# Altium footprint library XU-GENARAL PCB .PcbLib: 1176 footprints (part 11 of 75)
Each footprint in its own frame and in the unit in brackets; x right, y up, seen from the top. Pads: shape width x height; smd on the part's side, far side on the other; paste and mask are expansions set on the pad; w line width, h text height; cw(c..) or ccw(c..) is an arc to the next point about the centre after c.
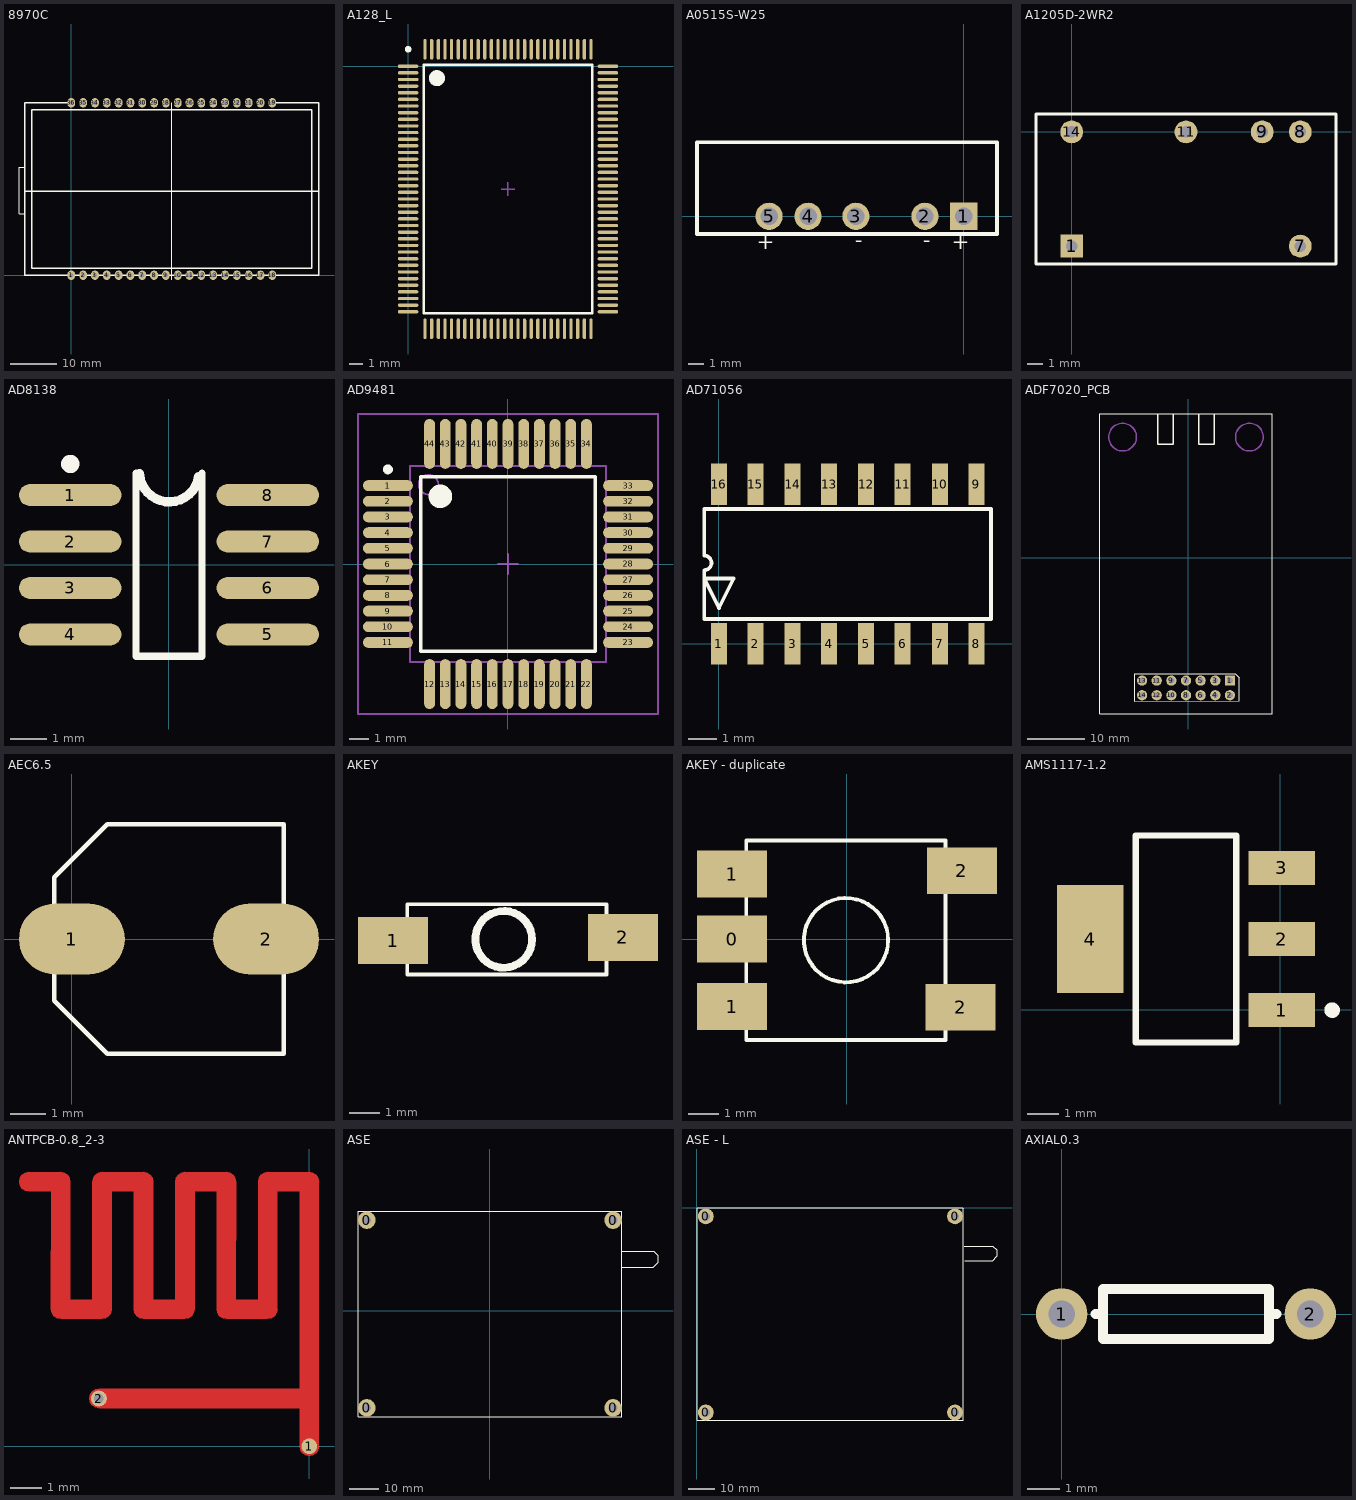
[diagram p10: the footprints below, top view; thin cyan lines are the x and y axes]

## 8970C [mil]
pads (36):
  oval 65x80 hole 35: 1(0,0) 2(100,0) 3(200,0) 4(300,0) 5(400,0) 6(500,0.07) 7(600,0.07) 8(700,0.07) 9(800,0.07) 10(900,0.07) 11(1000,0.07) 12(1100,0.07) 13(1200,0.07) 14(1300,0.07) 15(1400,0.07) 16(1500,0.07) 17(1600,0.07) 18(1700,0.07) 19(1700,1458.66) 20(1600,1458.66) 21(1500,1458.66) 22(1400,1458.66) 23(1300,1458.66) 24(1200,1458.66) 25(1100,1458.66) 26(1000,1458.66) 27(900,1458.66) 28(800,1458.66) 29(700,1458.66) 30(600,1458.66) 31(500,1458.66) 32(400,1458.66) 33(300,1458.66) 34(200,1458.66) 35(100,1458.66) 36(0,1458.66)
Top Overlay:
  lines w5: -402.91,518.66 -442.28,518.66 -442.28,912.36 -402.91,912.36
  lines w10: 850,-37.4 850,1458.66
  lines w12: -393.7,710.66 2094.97,710.66 ; 0,1458.66 -393.7,1458.66 -393.7,13.7 -393.7,0 0,0 1699.92,0 ; 1700,0.08 2093.7,0.08 2093.7,1458.66 1700,1458.66 ; -334.65,58.66 -334.65,1398.66 0,1398.66 1700,1398.66 2034.65,1398.66 2034.65,58.66 1700,58.66 0,58.66 -334.65,58.66

## A128_L [mm]
pads (128):
  oval 1.55x0.25 smd: 1(0,0) 2(0,-0.5) 3(0,-1) 4(0,-1.5) 5(0,-2) 6(0,-2.5) 7(0,-3) 8(0,-3.5) 9(0,-4) 10(0,-4.5) 11(0,-5) 12(0,-5.5) 13(0,-6) 14(0,-6.5) 15(0,-7) 16(0,-7.5) 17(0,-8) 18(0,-8.5) 19(0,-9) 20(0,-9.5) 21(0,-10) 22(0,-10.5) 23(0,-11) 24(0,-11.5) 25(0,-12) 26(0,-12.5) 27(0,-13) 28(0,-13.5) 29(0,-14) 30(0,-14.5) 31(0,-15) 32(0,-15.5) 33(0,-16) 34(0,-16.5) 35(0,-17) 36(0,-17.5) 37(0,-18) 38(0,-18.5) 65(15.05,-18.5) 66(15.05,-18) 67(15.05,-17.5) 68(15.05,-17) 69(15.05,-16.5) 70(15.05,-16) 71(15.05,-15.5) 72(15.05,-15) 73(15.05,-14.5) 74(15.05,-14) 75(15.05,-13.5) 76(15.05,-13) 77(15.05,-12.5) 78(15.05,-12) 79(15.05,-11.5) 80(15.05,-11) 81(15.05,-10.5) 82(15.05,-10) 83(15.05,-9.5) 84(15.05,-9) 85(15.05,-8.5) 86(15.05,-8) 87(15.05,-7.5) 88(15.05,-7) 89(15.05,-6.5) 90(15.05,-6) 91(15.05,-5.5) 92(15.05,-5) 93(15.05,-4.5) 94(15.05,-4) 95(15.05,-3.5) 96(15.05,-3) 97(15.05,-2.5) 98(15.05,-2) 99(15.05,-1.5) 100(15.05,-1) 101(15.05,-0.5) 102(15.05,0)
  oval 0.25x1.55 smd: 39(1.275,-19.775) 40(1.775,-19.775) 41(2.275,-19.775) 42(2.775,-19.775) 43(3.275,-19.775) 44(3.775,-19.775) 45(4.275,-19.775) 46(4.775,-19.775) 47(5.275,-19.775) 48(5.775,-19.775) 49(6.275,-19.775) 50(6.775,-19.775) 51(7.275,-19.775) 52(7.775,-19.775) 53(8.275,-19.775) 54(8.775,-19.775) 55(9.275,-19.775) 56(9.775,-19.775) 57(10.275,-19.775) 58(10.775,-19.775) 59(11.275,-19.775) 60(11.775,-19.775) 61(12.275,-19.775) 62(12.775,-19.775) 63(13.275,-19.775) 64(13.775,-19.775) 103(13.775,1.275) 104(13.275,1.275) 105(12.775,1.275) 106(12.275,1.275) 107(11.775,1.275) 108(11.275,1.275) 109(10.775,1.275) 110(10.275,1.275) 111(9.775,1.275) 112(9.275,1.275) 113(8.775,1.275) 114(8.275,1.275) 115(7.775,1.275) 116(7.275,1.275) 117(6.775,1.275) 118(6.275,1.275) 119(5.775,1.275) 120(5.275,1.275) 121(4.775,1.275) 122(4.275,1.275) 123(3.775,1.275) 124(3.275,1.275) 125(2.775,1.275) 126(2.275,1.275) 127(1.775,1.275) 128(1.275,1.275)
Top Overlay:
  circle w0.25: c0,1.275 r0.125
  circle w0.6: c2.175,-0.9 r0.3
  lines w0.2: 1.175,-18.6 1.175,0.1 13.875,0.1 13.875,-18.6 1.175,-18.6
Mechanical 15:
  lines w0.1: 7.025,-9.25 8.025,-9.25 ; 7.525,-9.75 7.525,-8.75

## A0515S-W25 [mil]
pads (5):
  rect 70x70 hole 45: 1(0,0)
  round 70 hole 45: 2(-100,0) 3(-277.17,0) 4(-400,0) 5(-500,0)
Top Overlay:
  lines w10: -685,-45 85,-45 85,190 -685,190 -685,-45
  text "+" at -485,-50 h40
  text "-" at -260,-50 h40
  text "-" at -85,-50 h40
  text "+" at 15,-50 h40

## A1205D-2WR2 [mil]
height 267.72
pads (6):
  rect 60x60 hole 30: 1(0,-300)
  round 60 hole 30: 7(600,-300) 8(600,0) 9(500,0) 11(300,0) 14(0,0)
Top Overlay:
  lines w7.87: -93.7,-346.85 -93.7,46.85 693.7,46.85 693.7,-346.85 -93.7,-346.85

## AD8138 [mm] "SOIC, 8-Leads, Body 5.0x4.0mm (max), Pitch 1.27mm, IPC Medium Density"
height 1.75
pads (8):
  oval 2.8x0.6 smd: 1(-2.7,1.905) 2(-2.7,0.635) 3(-2.7,-0.635) 4(-2.7,-1.905) 5(2.7,-1.905) 6(2.7,-0.635) 7(2.7,0.635) 8(2.7,1.905)
Top Overlay:
  circle w0.25: c-2.7,2.755 r0.125
  lines w0.2: -0.9,2.5 -0.9,-2.5 0.9,-2.5 0.9,2.5
  lines w0.254: -0.805,2.491 ccw(c0.008,2.531) 0.813,2.413

## AD9481 [mm] "TQFP, 44-Leads, Body 12.0x12.0mm (max), Pitch 0.80mm, IPC Medium Density"
height 1.2
pads (44):
  oval 2.55x0.55 smd: 1(-6.125,4) 2(-6.125,3.2) 3(-6.125,2.4) 4(-6.125,1.6) 5(-6.125,0.8) 6(-6.125,0) 7(-6.125,-0.8) 8(-6.125,-1.6) 9(-6.125,-2.4) 10(-6.125,-3.2) 11(-6.125,-4) 23(6.125,-4) 24(6.125,-3.2) 25(6.125,-2.4) 26(6.125,-1.6) 27(6.125,-0.8) 28(6.125,0) 29(6.125,0.8) 30(6.125,1.6) 31(6.125,2.4) 32(6.125,3.2) 33(6.125,4)
  oval 0.55x2.55 smd: 12(-4,-6.125) 13(-3.2,-6.125) 14(-2.4,-6.125) 15(-1.6,-6.125) 16(-0.8,-6.125) 17(0,-6.125) 18(0.8,-6.125) 19(1.6,-6.125) 20(2.4,-6.125) 21(3.2,-6.125) 22(4,-6.125) 34(4,6.125) 35(3.2,6.125) 36(2.4,6.125) 37(1.6,6.125) 38(0.8,6.125) 39(0,6.125) 40(-0.8,6.125) 41(-1.6,6.125) 42(-2.4,6.125) 43(-3.2,6.125) 44(-4,6.125)
Top Overlay:
  circle w0.25: c-6.125,4.825 r0.125
  circle w0.6: c-3.45,3.45 r0.3
  lines w0.2: -4.45,-4.45 -4.45,4.45 4.45,4.45 4.45,-4.45 -4.45,-4.45
Mechanical 13:
  circle w0.1: c-4.05,4.05 r0.5
  lines w0.1: -5,-5 -5,5 5,5 5,-5 -5,-5
Mechanical 15:
  lines w0.1: -0.5,0 0.5,0 ; 0,-0.5 0,0.5 ; -7.65,-7.65 -7.65,7.65 7.65,7.65 7.65,-7.65 -7.65,-7.65
3D body: height 1.2, standoff 1.1, extent -5,-5 5,5

## AD71056 [mm]
pads (16):
  rect 0.551x1.43 smd: 1(0,0) 2(1.26,0) 3(2.54,0) 4(3.8,0) 5(5.08,0) 6(6.34,0) 7(7.62,0) 8(8.88,0) 9(8.88,5.502) 10(7.62,5.502) 11(6.34,5.502) 12(5.08,5.502) 13(3.8,5.502) 14(2.54,5.502) 15(1.26,5.502) 16(0,5.502)
Top Overlay:
  lines w0.127: -0.508,3.04 cw(c-0.508,2.79) -0.508,2.54 -0.511,0.851 9.39,0.851 9.39,4.651 -0.511,4.651 -0.508,3.048 ; -0.511,2.25 0.5,2.25 0,1.232 -0.511,2.25

## ADF7020_PCB [mil]
pads (14):
  rect 70x70 hole 40: 1(285.55,-838.08)
  round 70 hole 40: 2(285.55,-938.08) 3(185.55,-838.08) 4(185.55,-938.08) 5(85.55,-838.08) 6(85.55,-938.08) 7(-14.45,-838.08) 8(-14.45,-938.08) 9(-114.45,-838.08) 10(-114.45,-938.08) 11(-214.45,-838.08) 12(-214.45,-938.08) 13(-314.45,-838.08) 14(-314.45,-938.08)
Top Overlay:
  lines w8: 305.55,-792.08 322.55,-792.08 ; 576,-1066.24 576,981 ; 576.1,-1065.24 -605,-1065.24 -605,982 576.1,982 ; 322.55,-792.08 -365.45,-792.08 -365.45,-978.08 348.55,-977.08 348.55,-818.08 322.55,-792.08
  lines w10: -207,981 -207,776 -102,776 -102,980 ; 73,981 73,775 180,775 180,981
Mechanical 1:
  circle w10: c-447.52,824.52 r94.49
  circle w10: c418.62,824.52 r94.49

## AEC6.5 [mm]
pads (2):
  oval 3x2 smd: 1(0,0) 2(5.5,0)
Top Overlay:
  lines w0.127: -0.5,-1.75 -0.5,1.75 1,3.25 6,3.25 6,-3.25 1,-3.25 -0.5,-1.75

## AKEY [mil]
height 21.65
pads (2):
  rect 90x60 smd: 1(-2249,-726.67) 2(-1954,-722.5)
Top Overlay:
  circle w10: c-2107,-725 r36.4
  lines w5: -2230.74,-770 -2230.74,-680 -1974.84,-680 -1974.84,-770 -2230.74,-770

## AKEY - duplicate [mil]
height 21.65
pads (5):
  rect 90x60 smd: 0(-147,0) 1(-147,-86.67) 1(-147,83.33) 2(146.33,-87.5) 2(148,87.5)
Top Overlay:
  circle w5: c-0.79,-1.48 r54.13
  lines w5: -128.74,-129.44 -128.74,126.47 127.16,126.47 127.16,-129.44 -128.74,-129.44

## AMS1117-1.2 [mm]
height 1.75
pads (4):
  rect 2.15x1.1 smd: 1(0.052,-0.014) 2(0.052,2.286) 3(0.052,4.586)
  rect 2.15x3.5 smd: 4(-6.148,2.286)
Top Overlay:
  circle w0.25: c1.677,-0.014 r0.125
  lines w0.2: -4.673,-1.064 -1.423,-1.064 -1.423,5.636 -4.673,5.636 -4.673,-1.064

## ANTPCB-0.8_2-3 [mm]
pads (2):
  round 0.5 smd: 1(0,0)
  round 0.5 hole 0.3: 2(-6.598,1.497)
Top Layer:
  region: 0.306,8.298 0.283,8.415 0.216,8.514 0.117,8.581 0,8.604 0,8.598 -1.3,8.604 -1.417,8.581 -1.516,8.514 -1.583,8.415 -1.606,8.298 -1.6,8.298 -1.6,4.598 -2.3,4.598 -2.294,8.298 -2.317,8.415 -2.384,8.514 -2.483,8.581 -2.6,8.604 -2.6,8.598 -3.9,8.604 -4.017,8.581 -4.116,8.514 -4.183,8.415 -4.206,8.298 -4.2,8.298 -4.2,4.598 -4.9,4.598 -4.894,8.298 -4.917,8.415 -4.984,8.514 -5.083,8.581 -5.2,8.604 -5.2,8.598 -6.5,8.604 -6.617,8.581 -6.716,8.514 -6.783,8.415 -6.806,8.298 -6.8,8.298 -6.8,4.598 -7.5,4.598 -7.494,8.298 -7.517,8.415 -7.584,8.514 -7.683,8.581 -7.8,8.604 -7.8,8.598 -8.8,8.604 -8.917,8.581 -9.016,8.514 -9.083,8.415 -9.106,8.298 -9.083,8.181 -9.016,8.082 -8.917,8.015 -8.8,7.992 -8.8,7.998 -8.1,7.998 -8.106,4.298 -8.083,4.181 -8.016,4.082 -7.917,4.015 -7.8,3.992 -7.8,3.998 -6.5,3.992 -6.383,4.015 -6.284,4.082 -6.217,4.181 -6.194,4.298 -6.2,4.298 -6.2,7.998 -5.5,7.998 -5.506,4.298 -5.483,4.181 -5.416,4.082 -5.317,4.015 -5.2,3.992 -5.2,3.998 -3.9,3.992 -3.783,4.015 -3.684,4.082 -3.617,4.181 -3.594,4.298 -3.6,4.298 -3.6,7.998 -2.9,7.998 -2.906,4.298 -2.883,4.181 -2.816,4.082 -2.717,4.015 -2.6,3.992 -2.6,3.998 -1.3,3.992 -1.183,4.015 -1.084,4.082 -1.017,4.181 -0.994,4.298 -1,4.298 -1,7.998 -0.3,7.998 -0.3,1.798 -6.6,1.804 -6.717,1.781 -6.816,1.714 -6.883,1.615 -6.906,1.498 -6.883,1.381 -6.816,1.282 -6.717,1.215 -6.6,1.192 -6.6,1.198 -0.3,1.198 -0.306,-0.002 -0.283,-0.119 -0.216,-0.218 -0.117,-0.285 0,-0.308 0.117,-0.285 0.216,-0.218 0.283,-0.119 0.306,-0.002 0.3,-0.002 0.3,8.298

## ASE [mm]
height 6.8
pads (4):
  round 6 hole 3: 0(-41.915,-33.068) 0(-41.915,30.932) 0(42.085,-33.068) 0(42.085,30.932)
Top Overlay:
  lines w0.254: 45.071,20.32 55.88,20.32 57.277,18.923 ; 45.198,14.859 55.753,14.859 57.277,16.383 ; 57.404,16.383 57.404,18.923 ; -44.915,-36.068 45.085,-36.068 45.085,33.932 -44.915,33.932 -44.915,-36.068

## ASE - L [mm]
height 6.8
pads (4):
  round 6 hole 3: 0(3.358,-77.277) 0(3.358,-3.277) 0(97.358,-77.277) 0(97.358,-3.277)
Top Overlay:
  lines w0.254: 0.051,-0.025 90.051,-0.025 ; 0.254,0.025 0.025,-0.203 0.025,-80.162 100.482,-80.162 100.482,-0.457 100.051,-0.025 89.814,-0.025 ; 100.865,-14.488 111.674,-14.488 113.071,-15.885 ; 100.992,-19.949 111.547,-19.949 113.071,-18.425 ; 113.198,-18.425 113.198,-15.885

## AXIAL0.3 [mil]
pads (2):
  round 62 hole 32: 1(0,0) 2(300,0)
Top Overlay:
  lines w12: 41,0 50,0 ; 259,0 250,0 ; 250,0 250,-30 50,-30 50,30 250,30 250,0